# Altium footprint library 3.10-RJ11 、RJ45、VGA接口.PcbLib: 21 footprints (part 1 of 2)
Each footprint in its own frame and in the unit in brackets; x right, y up, seen from the top. Pads: shape width x height; smd on the part's side, far side on the other; paste and mask are expansions set on the pad; w line width, h text height; cw(c..) or ccw(c..) is an arc to the next point about the centre after c.
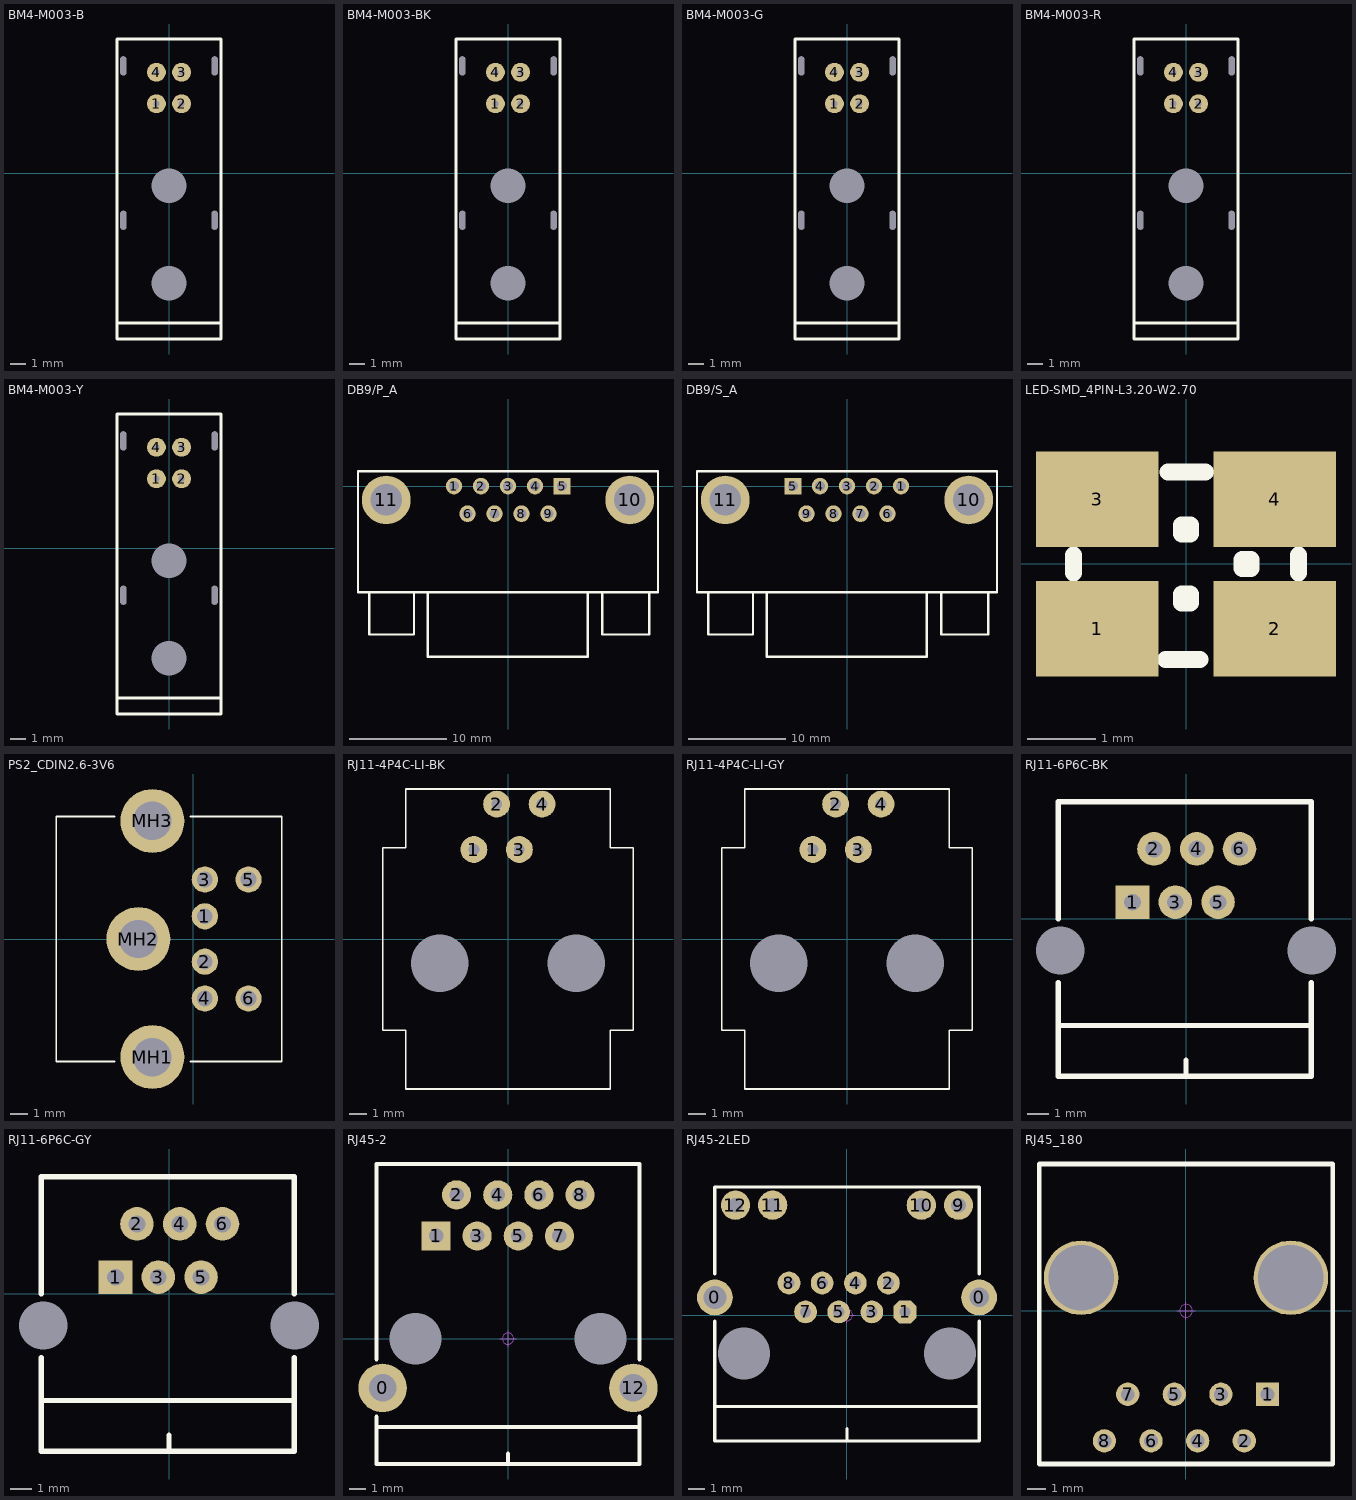
[diagram p0: the footprints below, top view; thin cyan lines are the x and y axes]

## BM4-M003-B [mm] "宝马头板端弯头（蓝色）      [ PCB学习群514746572 ]"
pads (10):
  round 0 hole 0.4 slot 1.2 at 90 deg unplated: 0(-2.9,-3) 0(-2.9,6.8) 0(2.9,-3) 0(2.9,6.8)
  round 0 hole 2.2 unplated: 0(0,-7) 0(0,-0.8)
  round 1.2 hole 0.4: 1(-0.8,4.4) 2(0.8,4.4) 3(0.8,6.4) 4(-0.8,6.4)
Top Overlay:
  lines w0.203: -3.302,-9.525 3.302,-9.525 ; -3.302,-10.541 3.302,-10.541 3.302,8.509 -3.302,8.509 -3.302,-10.541
3D body "BM4-m003-B.STEP": height 6.65, standoff -2.15, extent -3.1,-10.45 3.1,8.45

## BM4-M003-BK [mm] "宝马头板端弯头（黑色）      [ PCB学习群514746572 ]"
pads (10):
  round 0 hole 0.4 slot 1.2 at 90 deg unplated: 0(-2.9,-3) 0(-2.9,6.8) 0(2.9,-3) 0(2.9,6.8)
  round 0 hole 2.2 unplated: 0(0,-7) 0(0,-0.8)
  round 1.2 hole 0.4: 1(-0.8,4.4) 2(0.8,4.4) 3(0.8,6.4) 4(-0.8,6.4)
Top Overlay:
  lines w0.203: -3.302,-9.525 3.302,-9.525 ; -3.302,-10.541 3.302,-10.541 3.302,8.509 -3.302,8.509 -3.302,-10.541
3D body "BM4-m003-BK.STEP": height 6.65, standoff -2.15, extent -3.1,-10.45 3.1,8.45

## BM4-M003-G [mm] "宝马头板端弯头（绿色）      [ PCB学习群514746572 ]"
pads (10):
  round 0 hole 0.4 slot 1.2 at 90 deg unplated: 0(-2.9,-3) 0(-2.9,6.8) 0(2.9,-3) 0(2.9,6.8)
  round 0 hole 2.2 unplated: 0(0,-7) 0(0,-0.8)
  round 1.2 hole 0.4: 1(-0.8,4.4) 2(0.8,4.4) 3(0.8,6.4) 4(-0.8,6.4)
Top Overlay:
  lines w0.203: -3.302,-9.525 3.302,-9.525 ; -3.302,-10.541 -3.302,8.509 3.302,8.509 3.302,-10.541 -3.302,-10.541
3D body "BM4-m003-G.STEP": height 6.65, standoff -2.15, extent -3.1,-10.45 3.1,8.45

## BM4-M003-R [mm] "宝马头板端弯头（红色）      [ PCB学习群514746572 ]"
pads (10):
  round 0 hole 0.4 slot 1.2 at 90 deg unplated: 0(-2.9,-3) 0(-2.9,6.8) 0(2.9,-3) 0(2.9,6.8)
  round 0 hole 2.2 unplated: 0(0,-7) 0(0,-0.8)
  round 1.2 hole 0.4: 1(-0.8,4.4) 2(0.8,4.4) 3(0.8,6.4) 4(-0.8,6.4)
Top Overlay:
  lines w0.203: -3.302,-9.525 3.302,-9.525 ; -3.302,-10.541 3.302,-10.541 3.302,8.509 -3.302,8.509 -3.302,-10.541
3D body "BM4-m003-R.STEP": height 6.65, standoff -2.15, extent -3.1,-10.45 3.1,8.45

## BM4-M003-Y [mm] "宝马头板端弯头（黄色）      [ PCB学习群514746572 ]"
pads (10):
  round 0 hole 0.4 slot 1.2 at 90 deg unplated: 0(-2.9,-3) 0(-2.9,6.8) 0(2.9,-3) 0(2.9,6.8)
  round 0 hole 2.2 unplated: 0(0,-7) 0(0,-0.8)
  round 1.2 hole 0.4: 1(-0.8,4.4) 2(0.8,4.4) 3(0.8,6.4) 4(-0.8,6.4)
Top Overlay:
  lines w0.203: -3.302,-9.525 3.302,-9.525 ; -3.302,-10.541 -3.302,8.509 3.302,8.509 3.302,-10.541 -3.302,-10.541
3D body "BM4-m003-Y.STEP": height 6.65, standoff -2.15, extent -3.1,-10.45 3.1,8.45

## DB9/P_A [mm] "9针公头串口,31*18.5*12.5mm      [ PCB学习群514746572 ]"
pads (11):
  round 1.7 hole 1: 1(-5.546,0) 2(-2.773,0) 3(0,0) 4(2.773,0) 6(-4.155,-2.84) 7(-1.385,-2.84) 8(1.385,-2.84) 9(4.155,-2.84)
  rect 1.7x1.7 hole 1: 5(5.546,0)
  round 5 hole 3.25: 10(12.5,-1.42) 11(-12.5,-1.42)
Top Overlay:
  lines w0.254: -14.224,-10.922 -14.224,-15.24 -9.652,-15.24 -9.652,-10.922 ; -8.225,-10.922 -8.225,-17.526 8.175,-17.526 8.175,-10.922 ; 9.652,-10.922 9.652,-15.24 14.478,-15.24 14.478,-10.922 ; -15.4,-10.922 15.4,-10.922 15.4,1.524 -15.4,1.524 -15.4,-10.922
Mechanical 15:
  circle w0.05: c0,0 r0.35
  lines w0.05: -0.5,0 0.5,0 ; 0,-0.5 0,0.5
3D body "DB9_G.STEP": height 12.65, standoff -3.16, extent -15.45,-17.247 15.45,1.253

## DB9/S_A [mm] "9针母头串口,31*18.5*12.5mm      [ PCB学习群514746572 ]"
pads (11):
  round 1.7 hole 1: 1(5.546,0) 2(2.773,0) 3(0,0) 4(-2.773,0) 6(4.155,-2.84) 7(1.385,-2.84) 8(-1.385,-2.84) 9(-4.155,-2.84)
  rect 1.7x1.7 hole 1: 5(-5.546,0)
  round 5 hole 3.25: 10(12.5,-1.42) 11(-12.5,-1.42)
Top Overlay:
  lines w0.254: -14.224,-10.922 -14.224,-15.24 -9.652,-15.24 -9.652,-10.922 ; -8.225,-10.922 -8.225,-17.526 8.175,-17.526 8.175,-10.922 ; 9.652,-10.922 9.652,-15.24 14.478,-15.24 14.478,-10.922 ; -15.4,-10.922 -15.4,1.524 15.4,1.524 15.4,-10.922 -15.4,-10.922
Mechanical 15:
  circle w0.05: c0,0 r0.35
  lines w0.05: -0.5,0 0.5,0 ; 0,-0.5 0,0.5
3D body "DB9_M.STEP": height 12.65, standoff -3.16, extent -15.45,-17.247 15.45,1.253

## LED-SMD_4PIN-L3.20-W2.70 [mm] "[ PCBѧϰȺ514746572 ]"
pads (4):
  rect 1.8x1.4 smd: 1(-1.3,-0.95) 2(1.3,-0.95) 3(-1.3,0.95) 4(1.3,0.95)
Top Overlay:
  lines w0.254: -1.651,-0.127 -1.651,0.127 ; -0.3,-1.4 0.2,-1.4 ; -0.265,1.35 0.281,1.35 ; 1.651,-0.127 1.651,0.127 ; -0.064,-0.572 0.063,-0.572 0.063,-0.445 -0.064,-0.445 -0.064,-0.572 ; -0.064,0.444 0.063,0.444 0.063,0.571 -0.064,0.571 -0.064,0.444 ; 0.825,-0.064 0.952,-0.064 0.952,0.063 0.825,0.063 0.825,-0.064
3D body: height 0.8, standoff 0, extent -1.524,-1.397 1.524,1.397

## PS2_CDIN2.6-3V6 [mm] "Connector; Circular DIN, Thru-Hole; 6 Position; Right Angle; Pitch 2.1/2.6 mm; Body 14 x 12.9 x 13 mm (WxTxH)      [ PCBѧϰȺ514746572 ]"
pads (9):
  round 1.5 hole 0.9: 1(0.65,1.3) 2(0.65,-1.3) 3(0.65,3.4) 4(0.65,-3.4) 5(3.15,3.4) 6(3.15,-3.4)
  round 3.65 hole 2.2: MH1(-2.35,-6.75) MH2(-3.15,0) MH3(-2.35,6.75)
Top Overlay:
  lines w0.1: -4.51,-7 -7.85,-7 -7.85,7 -4.51,7 ; -0.19,-7 5.05,-7 5.05,7 -0.19,7

## RJ11-4P4C-LI-BK [mm] "16.5mm*13.8mm*16.38mm(长*宽*高)      [ PCB学习群514746572 ]"
pads (6):
  round 0 hole 3.2: 0(-3.81,-1.35) 0(3.81,-1.35)
  round 1.5 hole 0.6: 1(-1.905,5) 2(-0.635,7.54) 3(0.635,5) 4(1.905,7.54)
Top Overlay:
  lines w0.1: -7,-5.1 -5.715,-5.1 -5.715,-8.382 5.715,-8.382 5.715,-5.1 7,-5.1 7,5.1 5.715,5.1 5.715,8.382 -5.715,8.382 -5.715,5.1 -7,5.1 -7,-5.1
3D body "RJ11-4p4c-BK.STEP": height 16.38, standoff -3.2, extent -6.9,-8.25 6.9,8.25

## RJ11-4P4C-LI-GY [mm] "16.5mm*13.8mm*16.38mm(长*宽*高)      [ PCB学习群514746572 ]"
pads (6):
  round 0 hole 3.2: 0(-3.81,-1.35) 0(3.81,-1.35)
  round 1.5 hole 0.6: 1(-1.905,5) 2(-0.635,7.54) 3(0.635,5) 4(1.905,7.54)
Top Overlay:
  lines w0.1: -7,-5.1 -5.715,-5.1 -5.715,-8.382 5.715,-8.382 5.715,-5.1 7,-5.1 7,5.1 5.715,5.1 5.715,8.382 -5.715,8.382 -5.715,5.1 -7,5.1 -7,-5.1
3D body "RJ11-4p4c-GY.STEP": height 16.38, standoff -3.2, extent -6.9,-8.25 6.9,8.25

## RJ11-6P6C-BK [mm] "12mm*12mm*14.55mm(长*宽*高)      [ PCB学习群514746572 ]"
pads (8):
  round 0 hole 2.3: 0(-6,-1.5) 0(6,-1.5)
  rect 1.6x1.6 hole 0.8: 1(-2.55,0.8)
  round 1.6 hole 0.8: 2(-1.53,3.34) 3(-0.51,0.8) 4(0.51,3.34) 5(1.53,0.8) 6(2.55,3.34)
Top Overlay:
  lines w0.254: -6.096,-5.08 5.969,-5.08 ; -6.096,-3.048 -6.096,-7.5 5.969,-7.5 5.969,-3.048 ; -6.096,0 -6.096,5.588 5.969,5.588 5.969,0 ; 0,-7.5 0,-6.731
3D body "RJ11-6p6c-wi-BK.STEP": height 14.6, standoff -3.45, extent -7.15,-7.5 7.15,5.5

## RJ11-6P6C-GY [mm] "12mm*12mm*14.55mm(长*宽*高)      [ PCB学习群514746572 ]"
pads (8):
  round 0 hole 2.3: 0(-6,-1.5) 0(6,-1.5)
  rect 1.6x1.6 hole 0.8: 1(-2.55,0.8)
  round 1.6 hole 0.8: 2(-1.53,3.34) 3(-0.51,0.8) 4(0.51,3.34) 5(1.53,0.8) 6(2.55,3.34)
Top Overlay:
  lines w0.254: -6.096,-5.08 5.969,-5.08 ; -6.096,-3.048 -6.096,-7.5 5.969,-7.5 5.969,-3.048 ; -6.096,0 -6.096,5.588 5.969,5.588 5.969,0 ; 0,-7.5 0,-6.731
3D body "RJ11-6p6c-wi-GY.STEP": height 14.6, standoff -3.45, extent -7.15,-7.5 7.15,5.5

## RJ45-2 [mm] "RJ45屏蔽网络插座-短款8P      [ PCB学习群514746572 ]"
pads (12):
  round 3 hole 1.7: 0(-7.75,-3.048) 12(7.75,-3.048)
  rect 1.8x1.8 hole 0.9: 1(-4.445,6.35)
  round 1.8 hole 0.9: 2(-3.175,8.89) 3(-1.905,6.35) 4(-0.635,8.89) 5(0.635,6.35) 6(1.905,8.89) 7(3.175,6.35) 8(4.445,8.89)
  round 0 hole 3.2 unplated: 8(-5.715,0) 9(5.715,0)
Top Overlay:
  lines w0.254: -8.128,-5.45 8.128,-5.45 ; -8.128,-4.826 -8.128,-7.747 8.128,-7.747 8.128,-4.826 ; -8.128,-1.27 -8.128,10.795 8.128,10.795 8.128,-1.27 ; 0,-7.747 0,-7.112
Mechanical 15:
  circle w0.05: c0,0 r0.35
  lines w0.05: -0.5,0 0.5,0 ; 0,-0.5 0,0.5
3D body "Mod-Jack-K122449007-Stig-W.STEP": height 3.25, standoff -14.1, extent -7.999,-7.777 8.001,10.723

## RJ45-2LED [mm] "RJ45屏蔽网络插座带LED      [ PCB学习群514746572 ]"
pads (16):
  round 2.2 hole 1.4: 0(-8.128,1.08)
  round 2.2 hole 1.2: 0(8.128,1.08)
  oct 1.4x1.4 hole 0.7: 1(3.57,0.19)
  round 1.4 hole 0.7: 2(2.55,1.97) 3(1.53,0.19) 4(0.51,1.97) 5(-0.51,0.19) 6(-1.53,1.97) 7(-2.55,0.19) 8(-3.57,1.97)
  round 0 hole 3.2 unplated: 9(-6.35,-2.363) 10(6.35,-2.363)
  round 1.8 hole 0.9 unplated: 9(6.86,6.757) 10(4.57,6.757) 11(-4.57,6.757) 12(-6.86,6.757)
Top Overlay:
  lines w0.203: -8.128,-5.626 8.128,-5.626 ; -8.128,-0.381 -8.128,-7.747 8.128,-7.747 8.128,-0.381 ; 0,-7.747 0,-6.985 ; -8.128,2.54 -8.128,2.54 ; -8.128,2.54 -8.128,7.874 8.128,7.874 8.128,2.54 ; 8.128,2.54 8.128,2.54
Mechanical 15:
  circle w0.05: c0,0 r0.35
  lines w0.05: -0.5,0 0.5,0 ; 0,-0.5 0,0.5
3D body "RJ45-2led.STEP": height 12.85, standoff -2.95, extent -7.95,-7.65 7.95,7.75

## RJ45_180 [mil] "网线接口      [ PCB学习群514746572 ]"
height 53.15
pads (10):
  rect 50x50 hole 30: 1(175,-179.13)
  round 50 hole 30: 2(125,-279.13) 3(75,-179.13) 4(25,-279.13) 5(-25,-179.13) 6(-75,-279.13) 7(-125,-179.13) 8(-175,-279.13)
  round 160 hole 140: ""(-225,70.87) ""(225,70.87)
Top Overlay:
  lines w10: -314.96,-328.74 -314.96,314.96 314.96,314.96 314.96,-328.74 -314.96,-328.74
Mechanical 15:
  circle w1.97: c0,0 r13.78
  lines w1.97: -19.68,0 19.68,0 ; 0,-19.68 0,19.68
3D body "RJ-45, 8P8C, MOD JACK, TOP ENTRY, CAT 5E, RIA AJT26A8813.STEP": height 641.73, standoff -129.92, extent -305.11,-314.96 305.12,307.09